# Altium footprint library CPU.PcbLib: 56 footprints (part 2 of 4)
Each footprint in its own frame and in the unit in brackets; x right, y up, seen from the top. Pads: shape width x height; smd on the part's side, far side on the other; paste and mask are expansions set on the pad; w line width, h text height; cw(c..) or ccw(c..) is an arc to the next point about the centre after c.
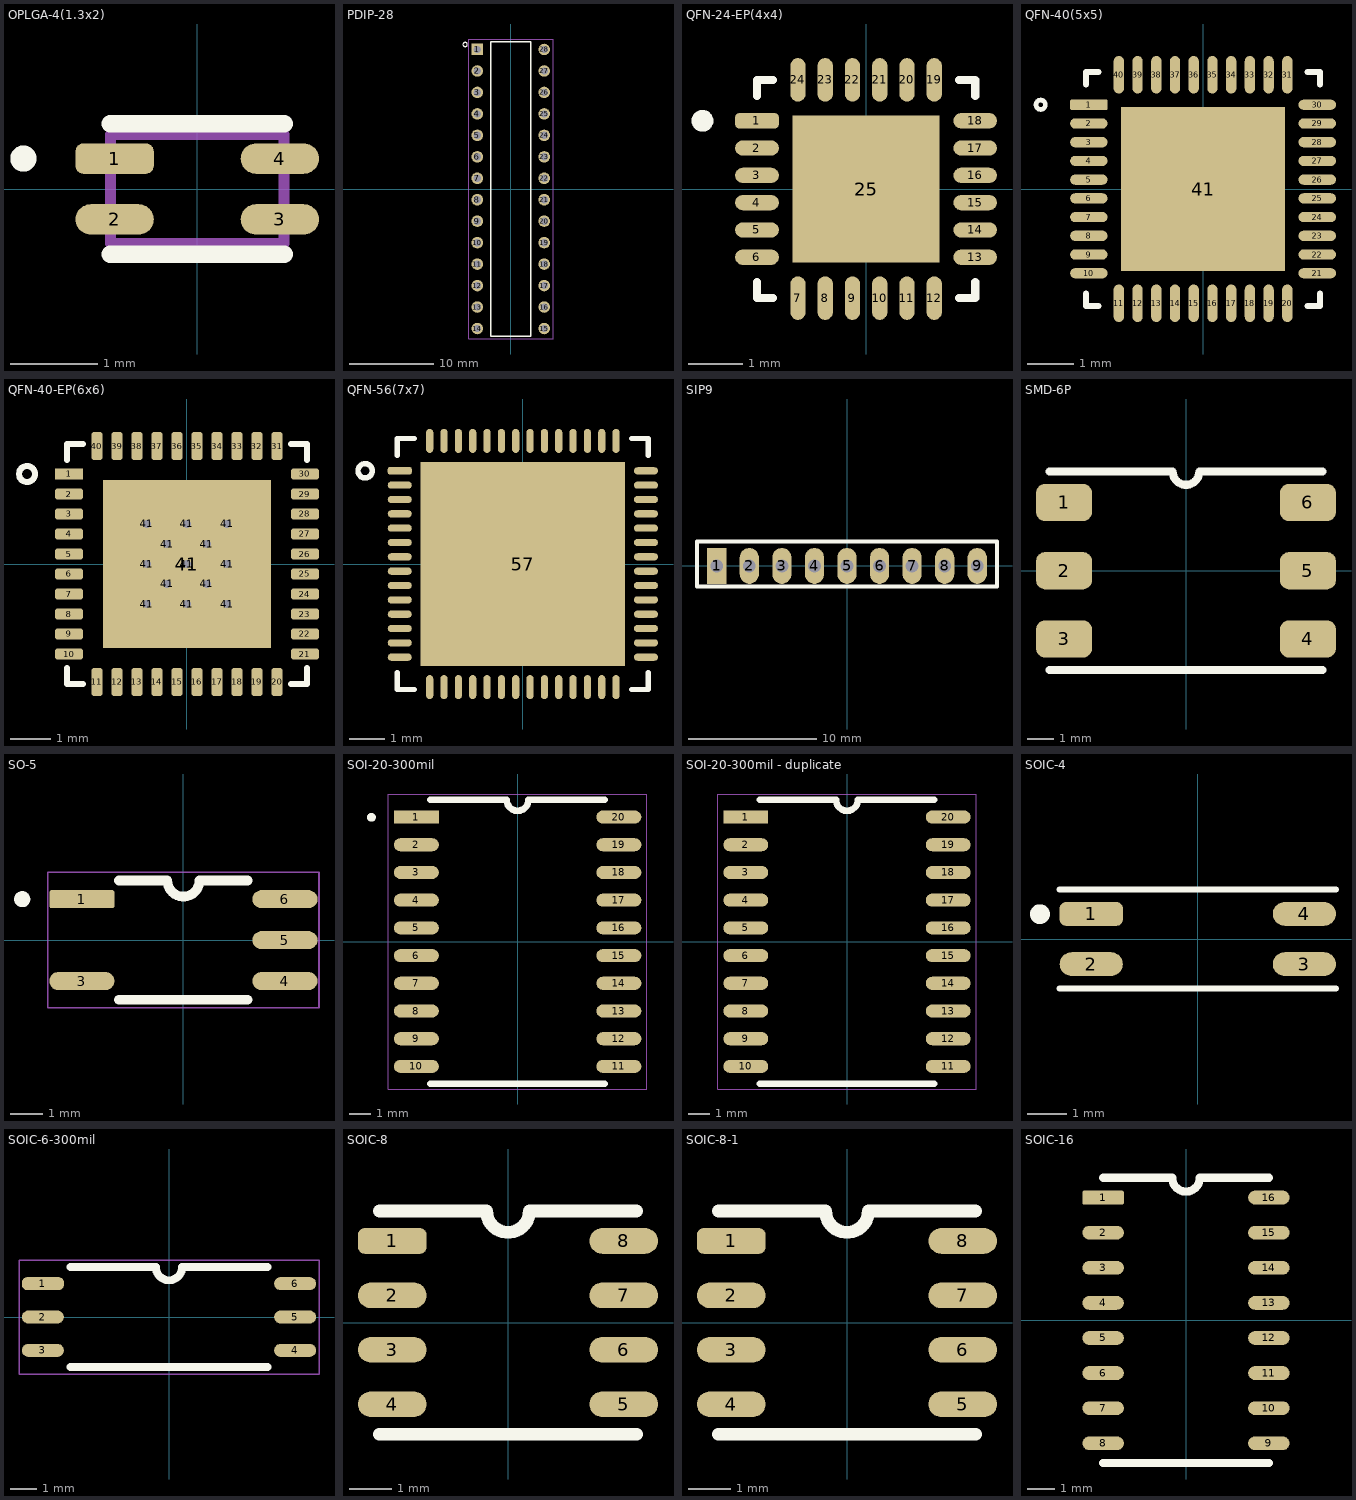
[diagram p1: the footprints below, top view; thin cyan lines are the x and y axes]

## OPLGA-4(1.3x2) [mm]
pads (4):
  rrect50% 0.9x0.35 smd: 1(-0.95,0.35)
  oval 0.9x0.35 smd: 2(-0.95,-0.35) 3(0.95,-0.35) 4(0.95,0.35)
Top Overlay:
  circle w0.2: c-2,0.35 r0.05
  lines w0.2: -1,-0.75 1,-0.75 ; -1,0.75 1,0.75
3D:
  lines w0.127: -1,-0.625 1,-0.625 1,0.625 -1,0.625 -1,-0.625
3D body "84593 VEML6040.stp": height 1, standoff 0, extent -1,-0.625 1,0.625

## PDIP-28 [mm]
pads (28):
  rect 1.358x1.358 hole 0.85: 1(-3.96,16.51)
  round 1.358 hole 0.85: 2(-3.96,13.97) 3(-3.96,11.43) 4(-3.96,8.89) 5(-3.96,6.35) 6(-3.96,3.81) 7(-3.96,1.27) 8(-3.96,-1.27) 9(-3.96,-3.81) 10(-3.96,-6.35) 11(-3.96,-8.89) 12(-3.96,-11.43) 13(-3.96,-13.97) 14(-3.96,-16.51) 15(3.96,-16.51) 16(3.96,-13.97) 17(3.96,-11.43) 18(3.96,-8.89) 19(3.96,-6.35) 20(3.96,-3.81) 21(3.96,-1.27) 22(3.96,1.27) 23(3.96,3.81) 24(3.96,6.35) 25(3.96,8.89) 26(3.96,11.43) 27(3.96,13.97) 28(3.96,16.51)
Top Overlay:
  circle w0: c-5.4,17.1 r0.254
  lines w0.152: -2.38,-17.4 2.38,-17.4 2.38,17.4 -2.38,17.4 -2.38,-17.4
Mechanical 15:
  lines w0.05: -5,-17.75 -5,17.75 5,17.75 5,-17.75 -5,-17.75
3D body "ATMEGA328P-PU--3DModel-STEP-56544.STEP": height 4.57, standoff -3.43, extent -3.95,-17.335 3.95,17.336

## QFN-24-EP(4x4) [mm]
height 0.95
pads (25):
  rrect50% 0.8x0.28 smd mask+0.1: 1(-2,1.25)
  oval 0.8x0.28 smd mask+0.1: 2(-2,0.75) 3(-2,0.25) 4(-2,-0.25) 5(-2,-0.75) 6(-2,-1.25) 13(2,-1.25) 14(2,-0.75) 15(2,-0.25) 16(2,0.25) 17(2,0.75) 18(2,1.25)
  oval 0.28x0.8 smd mask+0.1: 7(-1.25,-2) 8(-0.75,-2) 9(-0.25,-2) 10(0.25,-2) 11(0.75,-2) 12(1.25,-2) 19(1.25,2) 20(0.75,2) 21(0.25,2) 22(-0.25,2) 23(-0.75,2) 24(-1.25,2)
  rect 2.7x2.7 smd mask+0.1: 25(0,0)
Top Overlay:
  circle w0.2: c-3,1.25 r0.1
  lines w0.15: -2,-1.705 -2,-2 -1.705,-2 ; -2,1.705 -2,2 -1.705,2 ; 1.705,-2 2,-2 2,-1.705 ; 1.705,2 2,2 2,1.705
3D body "step_temp.STEP": height 0.93, standoff -0.02, extent -2,-2 2,2

## QFN-40(5x5) [mm]
pads (41):
  rrect25% 0.8x0.22 smd: 1(-2.44,1.8)
  oval 0.8x0.22 smd: 2(-2.44,1.4) 3(-2.44,1) 4(-2.44,0.6) 5(-2.44,0.2) 6(-2.44,-0.2) 7(-2.44,-0.6) 8(-2.44,-1) 9(-2.44,-1.4) 10(-2.44,-1.8) 21(2.44,-1.8) 22(2.44,-1.4) 23(2.44,-1) 24(2.44,-0.6) 25(2.44,-0.2) 26(2.44,0.2) 27(2.44,0.6) 28(2.44,1) 29(2.44,1.4) 30(2.44,1.8)
  oval 0.22x0.8 smd: 11(-1.8,-2.44) 12(-1.4,-2.44) 13(-1,-2.44) 14(-0.6,-2.44) 15(-0.2,-2.44) 16(0.2,-2.44) 17(0.6,-2.44) 18(1,-2.44) 19(1.4,-2.44) 20(1.8,-2.44) 31(1.8,2.44) 32(1.4,2.44) 33(1,2.44) 34(0.6,2.44) 35(0.2,2.44) 36(-0.2,2.44) 37(-0.6,2.44) 38(-1,2.44) 39(-1.4,2.44) 40(-1.8,2.44)
  rect 3.5x3.5 smd paste-0.64: 41(0,0)
Top Overlay:
  circle w0.1: c-3.47,1.8 r0.1
  lines w0.127: -2.5,-2.23 -2.5,-2.5 -2.23,-2.5 ; -2.5,2.23 -2.5,2.5 -2.23,2.5 ; 2.23,-2.5 2.5,-2.5 2.5,-2.23 ; 2.23,2.5 2.5,2.5 2.5,2.23
3D body "step_temp.STEP": height 0.8, standoff 0, extent -2.5,-2.5 2.5,2.5

## QFN-40-EP(6x6) [mm]
pads (54):
  rect 0.7x0.28 smd mask+0.15: 1(-2.95,2.25)
  rrect50% 0.7x0.28 smd mask+0.15: 2(-2.95,1.75) 3(-2.95,1.25) 4(-2.95,0.75) 5(-2.95,0.25) 6(-2.95,-0.25) 7(-2.95,-0.75) 8(-2.95,-1.25) 9(-2.95,-1.75) 10(-2.95,-2.25) 21(2.95,-2.25) 22(2.95,-1.75) 23(2.95,-1.25) 24(2.95,-0.75) 25(2.95,-0.25) 26(2.95,0.25) 27(2.95,0.75) 28(2.95,1.25) 29(2.95,1.75) 30(2.95,2.25)
  rrect50% 0.28x0.7 smd mask+0.15: 11(-2.25,-2.95) 12(-1.75,-2.95) 13(-1.25,-2.95) 14(-0.75,-2.95) 15(-0.25,-2.95) 16(0.25,-2.95) 17(0.75,-2.95) 18(1.25,-2.95) 19(1.75,-2.95) 20(2.25,-2.95) 31(2.25,2.95) 32(1.75,2.95) 33(1.25,2.95) 34(0.75,2.95) 35(0.25,2.95) 36(-0.25,2.95) 37(-0.75,2.95) 38(-1.25,2.95) 39(-1.75,2.95) 40(-2.25,2.95)
  round 0.4 hole 0.2: 41(-1,-1) 41(-1,0) 41(-1,1) 41(-0.5,-0.5) 41(-0.5,0.5) 41(0,-1) 41(0,0) 41(0,1) 41(0.5,-0.5) 41(0.5,0.5) 41(1,-1) 41(1,0) 41(1,1)
  rect 4.2x4.2 smd mask+0.15: 41(0,0)
Top Overlay:
  circle w0.15: c-4,2.25 r0.2
  lines w0.15: -3,-2.6 -3,-3 -2.6,-3 ; -3,2.6 -3,3 -2.6,3 ; 2.6,-3 3,-3 3,-2.6 ; 2.6,3 3,3 3,2.6
3D body "QFN-40 (6x6x0.9).step": height 0.92, standoff 0, extent -3,-3 3,3

## QFN-56(7x7) [mm]
height 0.9
pads (57):
  rrect50% 0.67x0.2 smd mask+0.05: 1(-3.435,2.6)
  oval 0.67x0.2 smd mask+0.05: 2(-3.435,2.2) 3(-3.435,1.8) 4(-3.435,1.4) 5(-3.435,1) 6(-3.435,0.6) 7(-3.435,0.2) 8(-3.435,-0.2) 9(-3.435,-0.6) 10(-3.435,-1) 11(-3.435,-1.4) 12(-3.435,-1.8) 13(-3.435,-2.2) 14(-3.435,-2.6) 29(3.435,-2.6) 30(3.435,-2.2) 31(3.435,-1.8) 32(3.435,-1.4) 33(3.435,-1) 34(3.435,-0.6) 35(3.435,-0.2) 36(3.435,0.2) 37(3.435,0.6) 38(3.435,1) 39(3.435,1.4) 40(3.435,1.8) 41(3.435,2.2) 42(3.435,2.6)
  oval 0.2x0.67 smd mask+0.05: 15(-2.6,-3.435) 16(-2.2,-3.435) 17(-1.8,-3.435) 18(-1.4,-3.435) 19(-1,-3.435) 20(-0.6,-3.435) 21(-0.2,-3.435) 22(0.2,-3.435) 23(0.6,-3.435) 24(1,-3.435) 25(1.4,-3.435) 26(1.8,-3.435) 27(2.2,-3.435) 28(2.6,-3.435) 43(2.6,3.435) 44(2.2,3.435) 45(1.8,3.435) 46(1.4,3.435) 47(1,3.435) 48(0.6,3.435) 49(0.2,3.435) 50(-0.2,3.435) 51(-0.6,3.435) 52(-1,3.435) 53(-1.4,3.435) 54(-1.8,3.435) 55(-2.2,3.435) 56(-2.6,3.435)
  rect 5.7x5.7 smd paste-4 mask+0.05: 57(0,0)
Top Overlay:
  circle w0.15: c-4.4,2.6 r0.2
  lines w0.15: -3.5,-3.03 -3.5,-3.5 -3.03,-3.5 ; -3.5,3.03 -3.5,3.5 -3.03,3.5 ; 3.03,-3.5 3.5,-3.5 3.5,-3.03 ; 3.03,3.5 3.5,3.5 3.5,3.03
Top Paste:
  region: -0.525,0.525 -2.325,0.525 -2.325,2.325 -0.525,2.325
  region: 2.325,0.525 0.525,0.525 0.525,2.325 2.325,2.325
  region: 2.325,-2.325 0.525,-2.325 0.525,-0.525 2.325,-0.525
  region: -0.525,-2.325 -2.325,-2.325 -2.325,-0.525 -0.525,-0.525
3D body "step_temp.STEP": height 0.9, standoff 0, extent -3.5,-3.5 3.5,3.5

## SIP9 [mm]
pads (9):
  rect 1.5x2.8 hole 1: 1(-10.16,0)
  oval 1.5x2.8 hole 1: 2(-7.62,0) 3(-5.08,0) 4(-2.54,0) 5(0,0) 6(2.54,0) 7(5.08,0) 8(7.62,0) 9(10.16,0)
Top Overlay:
  lines w0.3: -11.7,-1.6 -11.7,1.9 11.7,1.9 11.7,-1.6 -11.7,-1.6
3D body "step_temp.STEP": height 8.95, standoff -3.8, extent -11.66,-1.5 11.66,1.5

## SMD-6P [mm]
pads (6):
  rrect50% 2.09x1.39 smd: 1(-4.54,2.54) 2(-4.54,0) 3(-4.54,-2.54) 4(4.54,-2.54) 5(4.54,0) 6(4.54,2.54)
Top Overlay:
  lines w0.3: -5.08,-3.7 5.08,-3.7 ; -5.08,3.7 -0.5,3.7 ccw(c0,3.7) 0.5,3.7 5.08,3.7
3D body "MOC3021S-TA1.STEP": height 5.09, standoff 0.01, extent -4.583,-4.255 4.583,4.255

## SO-5 [mm]
pads (5):
  rrect25% 2.02x0.56 smd: 1(-3.15,1.27)
  oval 2.02x0.56 smd: 3(-3.15,-1.27) 4(3.15,-1.27) 5(3.15,0) 6(3.15,1.27)
Top Overlay:
  circle w0.3: c-5,1.27 r0.1
  lines w0.3: -2,-1.85 2,-1.85 ; -2,1.85 -0.5,1.85 ccw(c0,1.85) 0.5,1.85 2,1.85
3D:
  circle w0.2: c-5,1.27 r0.1
Mechanical 15:
  lines w0.05: -4.205,-2.1 4.205,-2.1 4.205,2.1 -4.205,2.1 -4.205,-2.1
3D body "step_temp.STEP": height 2.8, standoff 0, extent -3.5,-1.8 3.5,1.8

## SOI-20-300mil [mm]
pads (20):
  rect 2.06x0.6 smd: 1(-4.64,5.715)
  oval 2.06x0.6 smd: 2(-4.64,4.445) 3(-4.64,3.175) 4(-4.64,1.905) 5(-4.64,0.635) 6(-4.64,-0.635) 7(-4.64,-1.905) 8(-4.64,-3.175) 9(-4.64,-4.445) 10(-4.64,-5.715) 11(4.64,-5.715) 12(4.64,-4.445) 13(4.64,-3.175) 14(4.64,-1.905) 15(4.64,-0.635) 16(4.64,0.635) 17(4.64,1.905) 18(4.64,3.175) 19(4.64,4.445) 20(4.64,5.715)
Top Overlay:
  circle w0.2: c-6.7,5.7 r0.1
  lines w0.3: -4,-6.5 4,-6.5 ; -4,6.5 -0.5,6.5 ccw(c0,6.5) 0.5,6.5 4,6.5
Mechanical 15:
  lines w0.05: -5.92,-6.75 -5.92,6.75 5.92,6.75 5.92,-6.75 -5.92,-6.75
3D body "ADM2582EBRWZ-REEL7.STEP": height 2.65, standoff 0, extent -5.162,-6.4 5.162,6.4

## SOI-20-300mil - duplicate [mm]
pads (20):
  rect 2.06x0.6 smd: 1(-4.64,5.715)
  oval 2.06x0.6 smd: 2(-4.64,4.445) 3(-4.64,3.175) 4(-4.64,1.905) 5(-4.64,0.635) 6(-4.64,-0.635) 7(-4.64,-1.905) 8(-4.64,-3.175) 9(-4.64,-4.445) 10(-4.64,-5.715) 11(4.64,-5.715) 12(4.64,-4.445) 13(4.64,-3.175) 14(4.64,-1.905) 15(4.64,-0.635) 16(4.64,0.635) 17(4.64,1.905) 18(4.64,3.175) 19(4.64,4.445) 20(4.64,5.715)
Top Overlay:
  lines w0.3: -4,-6.5 4,-6.5 ; -4,6.5 -0.5,6.5 ccw(c0,6.5) 0.5,6.5 4,6.5
Mechanical 15:
  lines w0.05: -5.92,-6.75 -5.92,6.75 5.92,6.75 5.92,-6.75 -5.92,-6.75
3D body "ADM2582EBRWZ-REEL7.STEP": height 2.65, standoff 0, extent -5.162,-6.4 5.162,6.4

## SOIC-4 [mm]
pads (4):
  rrect50% 1.6x0.6 smd: 1(-2.7,0.635)
  oval 1.6x0.6 smd: 2(-2.7,-0.635) 3(2.7,-0.635) 4(2.7,0.635)
Top Overlay:
  circle w0.3: c-4,0.63 r0.1
  lines w0.15: -3.5,-1.25 3.5,-1.25 ; -3.5,1.25 3.5,1.25

## SOIC-6-300mil [mm]
pads (6):
  rrect85% 1.61x0.5 smd: 1(-4.8,1.27)
  oval 1.6x0.5 smd: 2(-4.8,0) 3(-4.8,-1.27) 4(4.8,-1.27) 5(4.8,0) 6(4.8,1.27)
Top Overlay:
  lines w0.3: -3.75,-1.9 3.75,-1.9 ; -3.75,1.9 -0.5,1.9 ccw(c0,1.9) 0.5,1.9 3.75,1.9
Mechanical 15:
  lines w0.05: -5.71,-2.17 -5.71,2.17 5.71,2.17 5.71,-2.17 -5.71,-2.17
3D body "TLP2745(TP,E.STEP": height 2.3, standoff 0, extent -5,-1.92 5,1.92

## SOIC-8 [mm]
pads (8):
  rrect50% 1.6x0.6 smd: 1(-2.7,1.905)
  oval 1.6x0.6 smd: 2(-2.7,0.635) 3(-2.7,-0.635) 4(-2.7,-1.905) 5(2.7,-1.905) 6(2.7,-0.635) 7(2.7,0.635) 8(2.7,1.905)
Top Overlay:
  lines w0.3: -3,-2.605 3,-2.605 ; -3,2.605 -0.5,2.605 ccw(c0,2.605) 0.5,2.605 3,2.605
3D body "NE555DT.STEP": height 1.75, standoff 0, extent -3,-2.45 3,2.45

## SOIC-8-1 [mm]
pads (8):
  rrect50% 1.6x0.6 smd: 1(-2.7,1.905)
  oval 1.6x0.6 smd: 2(-2.7,0.635) 3(-2.7,-0.635) 4(-2.7,-1.905) 5(2.7,-1.905) 6(2.7,-0.635) 7(2.7,0.635) 8(2.7,1.905)
Top Overlay:
  lines w0.3: -3,-2.605 3,-2.605 ; -3,2.605 -0.5,2.605 ccw(c0,2.605) 0.5,2.605 3,2.605
3D body "8_PIN_SOP.STEP": height 3.31, standoff 0, extent -2.975,-2.44 2.975,2.44

## SOIC-16 [mm]
pads (16):
  rrect25% 1.5x0.5 smd: 1(-3,4.445)
  oval 1.5x0.5 smd: 2(-3,3.175) 3(-3,1.905) 4(-3,0.635) 5(-3,-0.635) 6(-3,-1.905) 7(-3,-3.175) 8(-3,-4.445) 9(3,-4.445) 10(3,-3.175) 11(3,-1.905) 12(3,-0.635) 13(3,0.635) 14(3,1.905) 15(3,3.175) 16(3,4.445)
Top Overlay:
  lines w0.3: -3,-5.16 3,-5.16 ; -2.998,5.16 -0.498,5.16 ; -0.5,5.16 ccw(c0,5.16) 0.5,5.16 ; 0.502,5.16 3.002,5.16
3D body "User Library-SOIC-16-1.STEP": height 1.4, standoff 0, extent -3,-4.95 3,4.95